# Altium footprint library ZYF_IC.PcbLib: 42 footprints (part 2 of 3)
Each footprint in its own frame and in the unit in brackets; x right, y up, seen from the top. Pads: shape width x height; smd on the part's side, far side on the other; paste and mask are expansions set on the pad; w line width, h text height; cw(c..) or ccw(c..) is an arc to the next point about the centre after c.
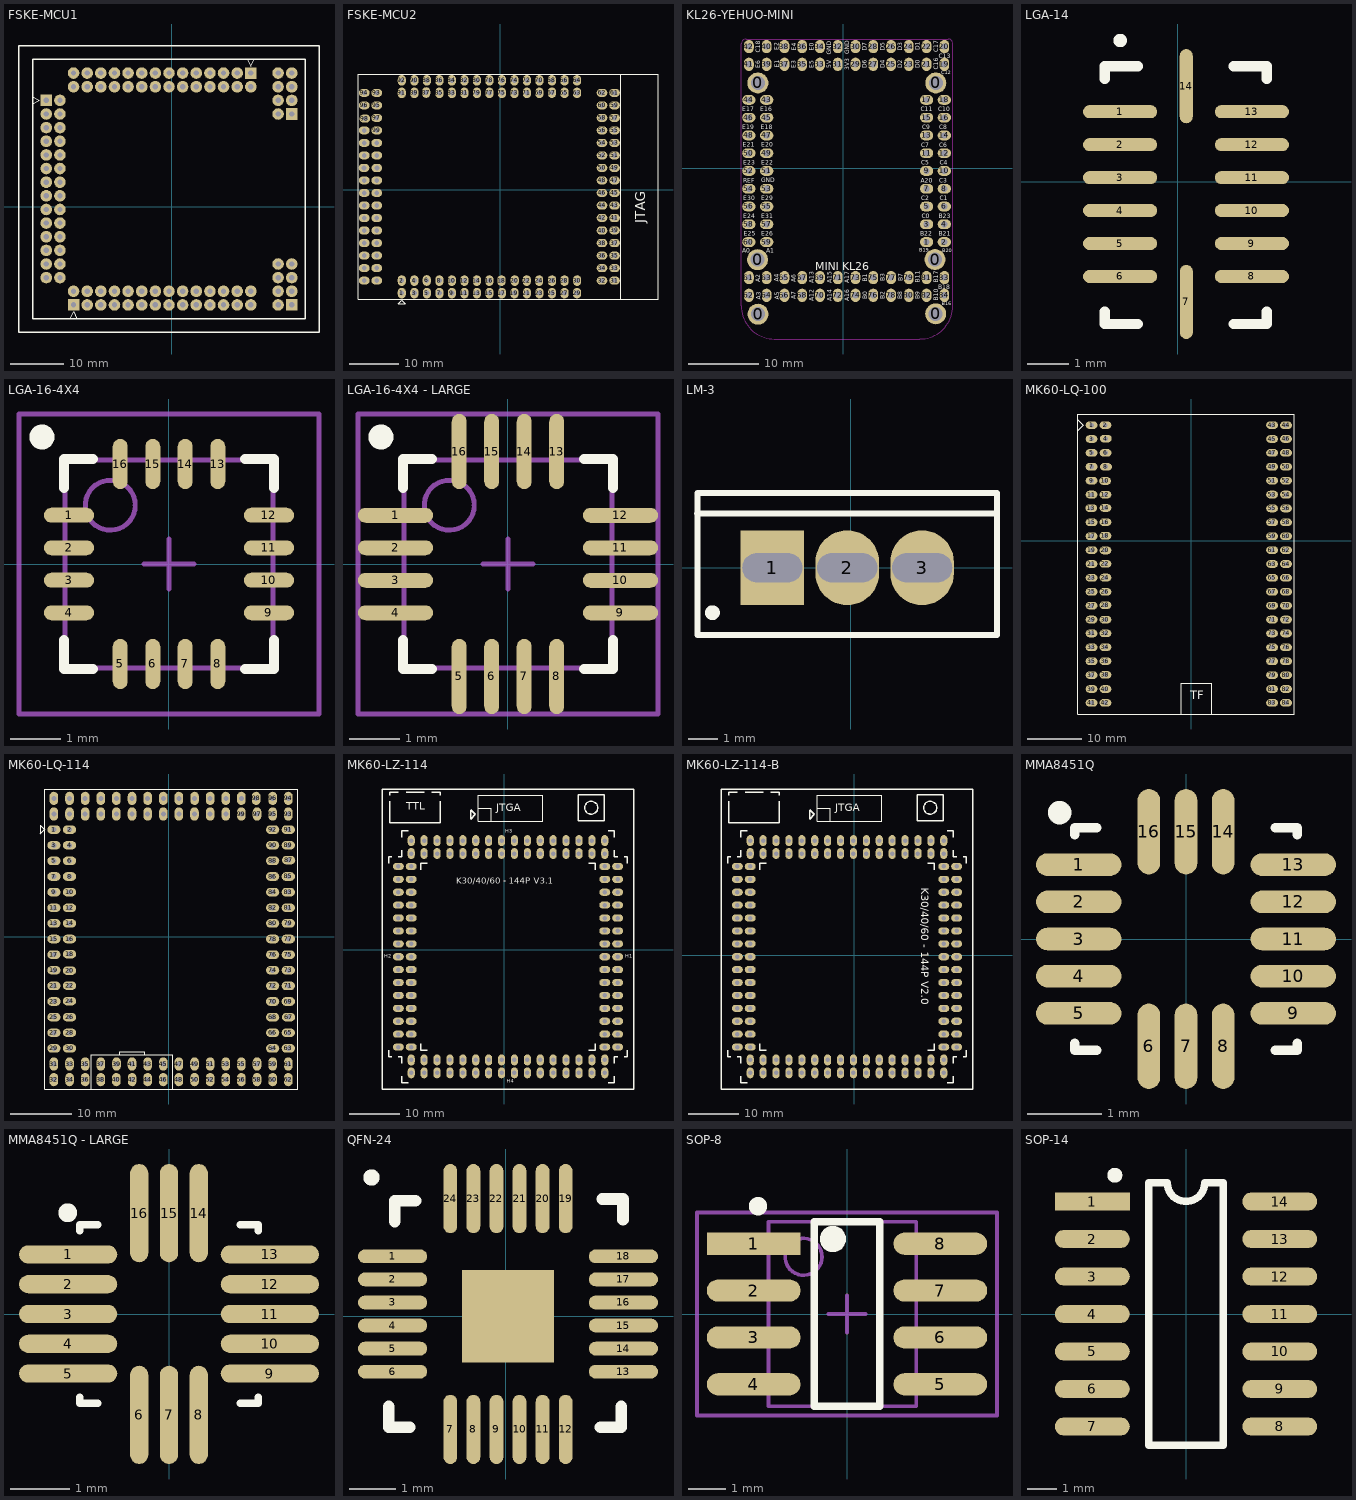
[diagram p1: the footprints below, top view; thin cyan lines are the x and y axes]

## FSKE-MCU1 [mil]
pads (100):
  rect 85x85 hole 39 paste+0: 101(-720,-720) 201(-920,780) 301(580,980) 401(880,-720) 501(880,680)
  round 85 hole 39 paste+0: 102(-720,-620) 103(-620,-720) 104(-620,-620) 105(-520,-720) 106(-520,-620) 107(-420,-720) 108(-420,-620) 109(-320,-720) 110(-320,-620) 111(-220,-720) 112(-220,-620) 113(-120,-720) 114(-120,-620) 115(-20,-720) 116(-20,-620) 117(80,-720) 118(80,-620) 119(180,-720) 120(180,-620) 121(280,-720) 122(280,-620) 123(380,-720) 124(380,-620) 125(480,-720) 126(480,-620) 127(580,-720) 128(580,-620) 202(-820,780) 203(-920,680) 204(-820,680) 205(-920,580) 206(-820,580) 207(-920,480) 208(-820,480) 209(-920,380) 210(-820,380) 211(-920,280) 212(-820,280) 213(-920,180) 214(-820,180) 215(-920,80) 216(-820,80) 217(-920,-20) 218(-820,-20) 219(-920,-120) 220(-820,-120) 221(-920,-220) 222(-820,-220) 223(-920,-320) 224(-820,-320) 225(-920,-420) 226(-820,-420) 227(-920,-520) 228(-820,-520) 302(580,880) 303(480,980) 304(480,880) 305(380,980) 306(380,880) 307(280,980) 308(280,880) 309(180,980) 310(180,880) 311(80,980) 312(80,880) 313(-20,980) 314(-20,880) 315(-120,980) 316(-120,880) 317(-220,980) 318(-220,880) 319(-320,980) 320(-320,880) 321(-420,980) 322(-420,880) 323(-520,980) 324(-520,880) 325(-620,980) 326(-620,880) 327(-720,980) 328(-720,880) 402(780,-720) 403(880,-620) 404(780,-620) 405(880,-520) 406(780,-520) 407(880,-420) 408(780,-420) 502(780,680) 503(880,780) 504(780,780) 505(880,880) 506(780,880) 507(880,980) 508(780,980)
Top Overlay:
  lines w8: -1020,755 -970,780 -1020,805 ; -745,-820 -720,-770 -695,-820 ; 555,1080 580,1030 605,1080
  lines w10: -1120,-920 1080,-920 1080,1180 -1120,1180 -1120,1140 -1120,-920 ; -1020,-820 980,-820 980,1080 -1020,1080 -1020,-820

## FSKE-MCU2 [mil]
pads (124):
  oval 65x85 hole 39: 1(-785,-825) 2(-785,-725) 3(-685,-825) 4(-685,-725) 5(-585,-825) 6(-585.39,-724.21) 7(-485,-825) 8(-485,-725) 9(-385,-825) 10(-385,-725) 11(-285,-825) 12(-284.21,-725) 13(-185,-825) 14(-185,-725) 15(-85,-825) 16(-85,-725) 17(15,-825) 18(11.85,-725) 19(115,-825) 20(117.36,-725) 21(215,-825) 22(213.82,-725) 23(315,-825) 24(312.64,-725) 25(415,-825) 26(415.39,-725) 27(515,-825) 28(515,-725) 29(615,-825) 30(615.39,-725) 63(615,775) 64(615,875) 65(515,775) 66(515,875) 67(415,776.97) 68(415,875) 69(315,775) 70(315,875) 71(215,775) 72(215,875) 73(115,775) 74(115,875) 75(15,775) 76(15,875) 77(-85,775) 78(-85,875) 79(-185,775) 80(-185,875) 81(-285,775) 82(-285,875) 83(-385,775) 84(-385,875) 85(-485,775) 86(-485,875) 87(-590.12,777.36) 88(-585,875) 89(-685,775) 90(-685,875) 91(-785,775) 92(-785,875)
  oval 85x65 hole 39: 31(915,-725) 32(815,-725) 33(915,-625) 34(815,-625) 35(915,-525) 36(815,-525) 37(915,-425) 38(815,-425) 39(915,-324.21) 40(815,-325) 41(915,-225) 42(815,-224.61) 43(915,-125) 44(815,-125) 45(915,-25) 46(815,-25) 47(915,75) 48(815,75) 49(915,175) 50(815,175) 51(915,275) 52(815,275) 53(915,375) 54(815,375) 55(915,475) 56(815,475) 57(915,575) 58(815,575) 59(915,675) 60(815,675) 61(915,775) 62(815,775) 93(-985,775) 94(-1085,775) 95(-985,675) 96(-1085,675) 97(-985,575) 98(-1079.88,569.09) 99(-985,475) 100(-1085,475) 101(-985,375) 102(-1085,375) 103(-985,275) 104(-1085,275) 105(-983.82,174.61) 106(-1086.97,175.39) 107(-985,75) 108(-1085,75) 109(-985,-25) 110(-1085,-25) 111(-985,-125) 112(-1085,-125) 113(-985,-225) 114(-1085,-225) 115(-985,-325) 116(-1085,-325) 117(-985,-425) 118(-1085,-425) 119(-985,-525) 120(-1085,-525) 121(-985,-625) 122(-1085,-625) 123(-985,-725) 124(-1085,-725)
Top Overlay:
  lines w7.87: -786.18,-884.06 -759.02,-911.61 -813.35,-911.61 -785.79,-884.06 ; 965,-875 965,925 ; -1135,-875 -1135,925 1262.24,925 1262.24,-875 -1135,-875
  text "JTAG" at 1160.67,-265.94 h78.74

## KL26-YEHUO-MINI [mil]
pads (90):
  round 118.11 hole 78.74: 0(-483.02,-513.45) 0(-481.61,481.31) 0(-480.66,-820.15) 0(515.52,-512.54) 0(519.34,-817.99) 0(519.77,481.2)
  oval 75x55 hole 35: 1(468,-414) 2(568,-414) 3(468,-314) 4(568,-314) 5(468,-214) 6(568,-214) 7(468,-114) 8(568,-114) 9(468,-14) 10(568,-14) 11(468,86) 12(568,86) 13(468,186) 14(568,186) 15(468,286) 16(568,286) 17(468,386) 18(568,386) 43(-432,386) 44(-532,386) 45(-432,286) 46(-532,286) 47(-432,186) 48(-532,186) 49(-432,86) 50(-532,86) 51(-432,-14) 52(-532,-14) 53(-432,-114) 54(-532,-114) 55(-432,-214) 56(-532,-214) 57(-432,-314) 58(-532,-314) 59(-432,-414) 60(-532,-414)
  oval 55x75 hole 35: 19(568,586) 20(568,686) 21(468,586) 22(468,686) 23(368,586) 24(368,686) 25(268,586) 26(268,686) 27(168,586) 28(168,686) 29(68,586) 30(68,686) 31(-32,586) 32(-32,686) 33(-132,586) 34(-132,686) 35(-232,586) 36(-232,686) 37(-332,586) 38(-332,686) 39(-432,586) 40(-432,686) 41(-532,586) 42(-532,686) 61(-532,-614) 62(-532,-714) 63(-432,-614) 64(-432,-714) 65(-332,-614) 66(-332,-714) 67(-232,-614) 68(-232,-714) 69(-132,-614) 70(-132,-714) 71(-32,-614) 72(-32,-714) 73(68,-614) 74(68,-714) 75(168,-614) 76(168,-714) 77(268,-614) 78(268,-714) 79(368,-614) 80(368,-714) 81(468,-614) 82(468,-714) 83(568,-614) 84(568,-714)
Top Overlay:
  text "B22" at 433.03,-380.01 h25
  text "B21" at 536.81,-379.11 h25
  text "B23" at 535.43,-280.25 h25
  text "C0" at 440.35,-278.91 h25
  text "C2" at 438.62,-178.24 h25
  text "C1" at 542.83,-179.18 h25
  text "C3" at 539.17,-79.62 h25
  text "A20" at 434.09,-80.76 h25
  text "C5" at 437.59,19.83 h25
  text "C4" at 542.2,19.83 h25
  text "C6" at 538.81,120.15 h25
  text "C7" at 437.91,120.38 h25
  text "C9" at 442.24,221.01 h25
  text "C8" at 540.51,221.49 h25
  text "C10" at 533.97,321.17 h25
  text "C11" at 434.21,320.74 h25
  text "B19" at 425.98,-468.16 h19.68
  text "B20" at 555.07,-470.33 h19.68
  text "E6" at -468.15,562.86 h25
  text "C18" at -467.09,650.82 h25
  text "E2" at -363.19,664.28 h25
  text "E1" at -362.49,566.76 h25
  text "E3" at -268.15,562.86 h25
  text "E4" at -265.83,663.02 h25
  text "E0" at -168.15,662.86 h25
  text "E5" at -168.15,562.86 h25
  text "GND" at -67.72,641.01 h25
  text "5V" at -67.8,563.26 h25
  text "3V3" at 33.46,554.08 h25
  text "GND" at 31.96,641.76 h25
  text "D7" at 131.85,662.86 h25
  text "D6" at 131.85,562.86 h25
  text "D5" at 231.85,662.86 h25
  text "D4" at 231.85,562.86 h25
  text "D3" at 331.85,662.86 h25
  text "D2" at 331.85,562.86 h25
  text "D0" at 429.99,563.57 h25
  text "D1" at 430.03,664.36 h25
  text "C17" at 533.7,652.98 h25
  text "C16" at 532.95,554.48 h25
  text "C13" at 536.33,621.49 h25
  text "C12" at 551.88,530.66 h19.68
  text "MINI KL26" at -157.72,-572.41 h45.28
  text "E25" at -561.93,-379.7 h25
  text "E26" at -462.25,-378.59 h25
  text "E31" at -463.47,-280.64 h25
  text "E24" at -564.93,-281.55 h25
  text "E30" at -563.94,-179.38 h25
  text "E29" at -462.92,-178.95 h25
  text "GND" at -462.92,-77.85 h25
  text "REF" at -562.56,-80.52 h25
  text "E23" at -564.38,21.41 h25
  text "E22" at -462.92,21.41 h25
  text "E20" at -462.92,121.52 h25
  text "E21" at -566.62,122.86 h25
  text "E19" at -568.39,221.64 h25
  text "E18" at -465.16,221.21 h25
  text "E16" at -467.37,321.41 h25
  text "E17" at -568.39,321.41 h25
  text "A0" at -568.75,-475.09 h25
  text "A1" at -434.38,-472.92 h25
  text "A2" at -466.93,-638.95 h25
  text "A3" at -466.19,-738.2 h25
  text "A4" at -363.63,-638 h25
  text "A5" at -362.41,-738.95 h25
  text "A6" at -268.98,-639.42 h25
  text "A7" at -267.01,-737.33 h25
  text "A13" at -166.54,-647.18 h25
  text "A12" at -166.54,-748.55 h25
  text "A15" at -66.54,-647.18 h25
  text "A14" at -66.54,-747.18 h25
  text "A17" at 33.46,-647.18 h25
  text "A16" at 33.46,-747.18 h25
  text "B1" at 133.03,-636.55 h25
  text "B0" at 134.36,-734.7 h25
  text "B3" at 232.75,-635.33 h25
  text "B2" at 232.08,-736.03 h25
  text "B7" at 332.95,-635.72 h25
  text "B8" at 330.86,-734.7 h25
  text "B11" at 429.29,-643 h25
  text "B9" at 429.29,-735.21 h25
  text "B17" at 532.44,-644.14 h25
  text "B10" at 533.46,-743.67 h25
  text "B18" at 534.6,-678.95 h25
  text "B16" at 553.3,-768.87 h19.68
Bottom Solder:
  text "USB TO UART" at 452.32,-945.29 h39.37
  text "USB DEVICE" at -50.6,-943.44 h39.37
Keep-Out Layer:
  lines w3.94: -574.73,-773.38 ccw(c-388.41,-773.38) -388.41,-959.7 430.66,-959.7 ccw(c430.66,-775.36) 614.99,-775.36 614.99,704.86 ccw(c591.24,704.86) 591.24,728.61 -548.02,728.61 ccw(c-548.02,701.9) -574.73,701.9 -574.73,-773.38

## LGA-14 [mm]
pads (14):
  oval 1.8x0.318 smd: 1(-1.4,1.7) 2(-1.4,0.9) 3(-1.4,0.1) 4(-1.4,-0.7) 5(-1.4,-1.5) 6(-1.4,-2.3) 8(1.8,-2.3) 9(1.8,-1.5) 10(1.8,-0.7) 11(1.8,0.1) 12(1.8,0.9) 13(1.8,1.7)
  oval 0.318x1.8 smd: 7(0.208,-2.918) 14(0.206,2.319)
Top Overlay:
  circle w0.254: c-1.397,3.429 r0.036
  lines w0.254: -1.777,-3.154 -1.777,-3.454 -0.977,-3.454 ; -1.777,2.504 -1.777,2.804 -0.977,2.804 ; 1.358,-3.454 2.158,-3.454 2.158,-3.154 ; 1.358,2.804 2.158,2.804 2.158,2.504
3D body: height 0.98, standoff -0.45, extent -1.296,-2.802 1.704,2.198

## LGA-16-4X4 [mm] "QFN, 16-Leads, Body 4x4 mm, Pitch 0.65mm, IPC Low Density"
height 1
pads (16):
  oval 1x0.3 smd: 1(-2,0.975) 2(-2,0.325) 3(-2,-0.325) 4(-2,-0.975) 9(2,-0.975) 10(2,-0.325) 11(2,0.325) 12(2,0.975)
  oval 0.3x1 smd: 5(-0.975,-2) 6(-0.325,-2) 7(0.325,-2) 8(0.975,-2) 13(0.975,2) 14(0.325,2) 15(-0.325,2) 16(-0.975,2)
Top Overlay:
  circle w0.25: c-2.54,2.54 r0.125
  lines w0.2: -2.1,-1.525 -2.1,-2.1 -1.525,-2.1 ; -2.1,1.525 -2.1,2.1 -1.525,2.1 ; 1.525,-2.1 2.1,-2.1 2.1,-1.525 ; 1.525,2.1 2.1,2.1 2.1,1.525
Mechanical 13:
  circle w0.1: c-1.175,1.175 r0.5
  lines w0.1: -2.075,-2.075 2.075,-2.075 2.075,2.075 -2.075,2.075 -2.075,-2.075
Mechanical 15:
  lines w0.1: -0.5,0 0.5,0 ; 0,-0.5 0,0.5 ; -3,-3 3,-3 3,3 -3,3 -3,-3
3D body: height 0.98, standoff 0, extent -2.003,-1.996 1.997,2.004

## LGA-16-4X4 - LARGE [mm] "QFN, 16-Leads, Body 4x4 mm, Pitch 0.65mm, IPC Low Density"
height 1
pads (16):
  oval 1.5x0.3 smd: 1(-2.25,0.975) 2(-2.25,0.325) 3(-2.25,-0.325) 4(-2.25,-0.975) 9(2.25,-0.975) 10(2.25,-0.325) 11(2.25,0.325) 12(2.25,0.975)
  oval 0.3x1.5 smd: 5(-0.975,-2.25) 6(-0.325,-2.25) 7(0.325,-2.25) 8(0.975,-2.25) 13(0.975,2.25) 14(0.325,2.25) 15(-0.325,2.25) 16(-0.975,2.25)
Top Overlay:
  circle w0.25: c-2.54,2.54 r0.125
  lines w0.2: -2.1,-1.525 -2.1,-2.1 -1.525,-2.1 ; -2.1,1.525 -2.1,2.1 -1.525,2.1 ; 1.525,-2.1 2.1,-2.1 2.1,-1.525 ; 1.525,2.1 2.1,2.1 2.1,1.525
Mechanical 13:
  circle w0.1: c-1.175,1.175 r0.5
  lines w0.1: -2.075,-2.075 -2.075,2.075 2.075,2.075 2.075,-2.075 -2.075,-2.075
Mechanical 15:
  lines w0.1: -0.5,0 0.5,0 ; 0,-0.5 0,0.5 ; -3,-3 -3,3 3,3 3,-3 -3,-3
3D body: height 0.98, standoff 0, extent -2.003,-1.996 1.997,2.004

## LM-3 [mil]
pads (3):
  rect 85x100 hole 39 slot 80 at 0 deg: 1(-105,0)
  oval 85x100 hole 39 slot 80 at 0 deg: 2(-5,0) 3(95,0)
Top Overlay:
  circle w9.84: c-185,-60 r4.92
  lines w7.87: -205.63,72.52 195,72.52 ; -205,-90 -205,100 195,100 195,-90 -205,-90
Mechanical 15:
  lines w3.94: -24.69,10 14.69,10 ; -5,-9.69 -5,29.68
3D body: height 400, standoff -207.87, extent -204.99,-84.64 195.01,100.01

## MK60-LQ-100 [mil]
pads (84):
  oval 85x55 hole 32.28: 1(-717,832) 2(-617,832) 3(-717,732) 4(-614.24,734.76) 5(-717,632) 6(-616.21,632.39) 7(-717,532) 8(-613.06,531.21) 9(-717,432) 10(-619.36,429.64) 11(-717,332) 12(-617,331.21) 13(-718.97,234.36) 14(-617,235.54) 15(-717,132) 16(-617,133.57) 17(-717,32) 18(-617,35.15) 19(-717,-68) 20(-617,-70.36) 21(-717,-168) 22(-617,-166.82) 23(-717,-268) 24(-617,-265.64) 25(-717,-368) 26(-617,-368.39) 27(-717,-468) 28(-617,-464.46) 29(-717,-568) 30(-617,-568.39) 31(-717,-668) 32(-617,-667.61) 33(-717,-768) 34(-617,-766.82) 35(-717,-868) 36(-617,-867.61) 37(-717,-968) 38(-617,-966.43) 39(-717,-1068) 40(-617,-1068.39) 41(-717,-1168) 42(-617,-1167.61) 43(583,832) 44(683,830.43) 45(583,732) 46(683,732.39) 47(583,632) 48(683,632) 49(583,532) 50(683,532) 51(583,432) 52(683,432) 53(583,332) 54(683,332) 55(583,232) 56(683,232) 57(583,132) 58(683,132) 59(583,32) 60(683,32) 61(583,-68) 62(683,-68) 63(583,-168) 64(683,-168) 65(583,-268) 66(683,-268) 67(583,-368) 68(683,-368) 69(583,-468) 70(683,-468) 71(583,-568) 72(683,-568) 73(583,-668) 74(683,-668) 75(583,-768) 76(683,-768) 77(583,-868) 78(683,-868) 79(583,-968) 80(683,-968) 81(583,-1068) 82(683,-1068) 83(583,-1168) 84(683,-1168)
Top Overlay:
  lines w7.87: -817,792 -777,832 -817,872 ; -72,-1248 -72,-1028 148,-1028 148,-1248 ; -817,-1248 -817,912 743,912 743,-1248 -817,-1248
  text "TF" at -7,-1143 h60
3D body: height 334.65, standoff -125.98, extent 529.58,-1222.93 726.43,886.91
3D body: height 334.65, standoff -125.98, extent -765.42,-1217.93 -568.57,891.92

## MK60-LQ-114 [mil]
pads (124):
  oval 85x55 hole 32: 1(-734,687) 2(-634,687) 3(-734,587) 4(-634,587) 5(-734,487) 6(-634,487) 7(-734,387) 8(-634,387) 9(-734,287) 10(-634,287) 11(-734,187) 12(-634,186.21) 13(-734,87) 14(-634,87) 15(-734,-13) 16(-634,-13) 17(-734,-113) 18(-634,-109.85) 19(-734,-213) 20(-634,-215.36) 21(-734,-313) 22(-634,-311.82) 23(-734,-413) 24(-634,-410.64) 25(-734,-513) 26(-634,-513.39) 27(-734,-613) 28(-634,-613) 29(-734,-713) 30(-634,-713.39) 63(766,-713) 64(666,-713) 65(766,-613) 66(666,-613) 67(767.97,-513) 68(666,-513) 69(766,-413) 70(666,-413) 71(766,-313) 72(666,-313) 73(766,-213) 74(666,-213) 75(766,-113) 76(666,-113) 77(766,-13) 78(666,-13) 79(766,87) 80(666,87) 81(766,187) 82(666,187) 83(766,287) 84(666,287) 85(766,387) 86(666,387) 87(768.36,492.12) 88(666,487) 89(766,587) 90(666,587) 91(766,687) 92(666,687)
  oval 55x85 hole 32: 31(-734,-813) 32(-734,-913) 33(-634,-813) 34(-634,-913) 35(-534,-813) 36(-534,-913) 37(-434,-813) 38(-434,-913) 39(-333.21,-813) 40(-334,-913) 41(-234,-813) 42(-233.61,-913) 43(-134,-813) 44(-134,-913) 45(-34,-813) 46(-34,-913) 47(66,-813) 48(66,-913) 49(166,-813) 50(166,-913) 51(266,-813) 52(266,-913) 53(366,-813) 54(366,-913) 55(466,-813) 56(466,-913) 57(566,-813) 58(566,-913) 59(666,-813) 60(666,-913) 61(766,-813) 62(766,-913) 93(766,787) 94(766,887) 95(666,787) 96(666,887) 97(566,787) 98(560.09,887) 99(466,787) 100(466,887) 101(366,787) 102(366,887) 103(266,787) 104(266,887) 105(165.61,787) 106(166.39,887) 107(66,787) 108(66,887) 109(-34,787) 110(-34,887) 111(-134,787) 112(-134,887) 113(-234,787) 114(-234,887) 115(-334,787) 116(-334,887) 117(-434,787) 118(-434,887) 119(-534,787) 120(-534,887) 121(-634,787) 122(-634,887) 123(-734,787) 124(-734,887)
Top Overlay:
  lines w5.91: -494,-973 -494,-753 26,-753 26,-973 ; -314,-753 -314,-733 -154,-733 -154,-753
  lines w7.87: -793.06,687.79 -820.61,715.35 -820.61,661.02 -793.06,688.18 ; -794,-973 -794,947 826,947 826,-973 -794,-973
3D body: height 334.65, standoff -125.98, extent -583.84,-966.43 626,-769.57
3D body: height 334.65, standoff -125.98, extent -583.84,748.57 626,945.43
3D body: height 334.65, standoff -125.98, extent 622.58,-962.93 819.43,946.92
3D body: height 334.65, standoff -125.98, extent -777.43,-962.84 -580.57,947

## MK60-LZ-114 [mil]
pads (124):
  oval 85x55 hole 35: 101(880,-755) 102(780,-755) 103(880,-655) 104(780,-655) 105(880,-555) 106(780,-555) 107(880,-455) 108(780,-455) 109(880,-355) 110(780,-355) 111(880,-255) 112(780,-255) 113(880,-155) 114(780,-155) 115(880,-55) 116(780,-55) 117(880,45) 118(780,45) 119(880,145) 120(780,145) 121(880,245) 122(780,245) 123(880,345) 124(780,345) 125(880,445) 126(780,445) 127(880,545) 128(780,545) 129(880,645) 130(780,645) 201(-720,-755) 202(-820,-755) 203(-720,-655) 204(-820,-655) 205(-720,-555) 206(-820,-555) 207(-720,-455) 208(-820,-455) 209(-720,-355) 210(-820,-355) 211(-720,-255) 212(-820,-255) 213(-720,-155) 214(-820,-155) 215(-720,-55) 216(-820,-55) 217(-720,45) 218(-820,45) 219(-720,145) 220(-820,145) 221(-720,245) 222(-820,245) 223(-720,345) 224(-820,345) 225(-720,445) 226(-820,445) 227(-720,545) 228(-820,545) 229(-720,645) 230(-820,645)
  oval 55x85 hole 35: 301(780,845) 302(780,745) 303(680,845) 304(680,745) 305(580,845) 306(580,745) 307(480,845) 308(480,745) 309(380,845) 310(380,745) 311(280,845) 312(280,745) 313(180,845) 314(180,745) 315(80,845) 316(80,745) 317(-20,845) 318(-20,745) 319(-120,845) 320(-120,745) 321(-220,845) 322(-220,745) 323(-320,845) 324(-320,745) 325(-420,845) 326(-420,745) 327(-520,845) 328(-520,745) 329(-620,845) 330(-620,745) 331(-720,845) 332(-720,745) 401(780,-855) 402(780,-955) 403(680,-855) 404(680,-955) 405(580,-855) 406(580,-955) 407(480,-855) 408(480,-955) 409(380,-855) 410(380,-955) 411(280,-855) 412(280,-955) 413(180,-855) 414(180,-955) 415(80,-855) 416(80,-955) 417(-20,-855) 418(-20,-955) 419(-120,-855) 420(-120,-955) 421(-220,-855) 422(-220,-955) 423(-320,-855) 424(-320,-955) 425(-420,-855) 426(-420,-955) 427(-520,-855) 428(-520,-955) 429(-620,-855) 430(-620,-955) 431(-720,-855) 432(-720,-955)
Top Overlay:
  circle w10: c675,1100 r50
  lines w7.87: -200,1095 -100,1095 -100,995 ; -200,995 -200,1195 300,1195 300,995 -200,995
  lines w10: -895,-780 -895,-830 -870,-830 ; -895,670 -895,720 -870,720 ; -886.85,1150 -886.85,982.2 -493.15,982.2 -493.15,1150 ; -886.85,1195 -886.85,1218.43 -820,1218.43 ; -820,-830 -795,-830 -795,-880 ; -820,720 -795,720 -795,770 ; -795,-980 -795,-1030 -745,-1030 ; -795,870 -795,920 -745,920 ; -760,1220 -620,1220 ; -645,-730 -645,-780 -595,-780 ; -645,620 -645,670 -595,670 ; -560,1218.43 -493.15,1218.43 -493.15,1195 ; -260,1080 -260,1010 -222.5,1047.5 -257.5,1082.5 ; 655,-780 705,-780 705,-730 ; 655,670 705,670 705,620 ; 805,-1030 855,-1030 855,-980 ; 805,920 855,920 855,870 ; 855,-880 855,-830 880,-830 ; 855,770 855,720 880,720 ; 930,-830 955,-830 955,-780 ; 930,720 955,720 955,670 ; -945,-1080 -945,-455 -945,1245 1005,1245 1005,-555 1005,-1080 -945,-1080 ; 575,1000 575,1200 775,1200 775,1000 575,1000
  text "V3.1" at 230,495 h80
  text "TTL" at -760,1065 h100
  text "H3" at 10,895 h50
  text "H2" at -930,-75 h50
  text "H4" at 20,-1045 h50
  text "H1" at 940,-75 h50
  text "JTGA" at -60,1055 h100
  text "K30/40/60 - 144P" at -370,495 h80

## MK60-LZ-114-B [mil]
pads (124):
  oval 55x85 hole 35: 1(694,-811) 2(694,-911) 3(594,-811) 4(594,-911) 5(494,-811) 6(494,-911) 7(394,-811) 8(394,-911) 9(294,-811) 10(294,-911) 11(194,-811) 12(194,-911) 13(94,-811) 14(94,-911) 15(-6,-811) 16(-6,-911) 17(-106,-811) 18(-106,-911) 19(-206,-811) 20(-206,-911) 21(-306,-811) 22(-306,-911) 23(-406,-811) 24(-406,-911) 25(-506,-811) 26(-506,-911) 27(-606,-811) 28(-606,-911) 29(-706,-811) 30(-706,-911) 31(-806,-811) 32(-806,-911) 63(-806,789) 64(-806,889) 65(-706,789) 66(-706,889) 67(-606,789) 68(-606,889) 69(-506,789) 70(-506,889) 71(-406,789) 72(-406,889) 73(-306,789) 74(-306,889) 75(-206,789) 76(-206,889) 77(-106,789) 78(-106,889) 79(-6,789) 80(-6,889) 81(94,789) 82(94,889) 83(194,789) 84(194,889) 85(294,789) 86(294,889) 87(394,789) 88(394,889) 89(494,789) 90(494,889) 91(594,789) 92(594,889) 93(694,789) 94(694,889)
  oval 85x55 hole 35: 33(-806,-711) 34(-906,-711) 35(-806,-611) 36(-906,-611) 37(-806,-511) 38(-906,-511) 39(-806,-411) 40(-906,-411) 41(-806,-311) 42(-906,-311) 43(-806,-211) 44(-906,-211) 45(-806,-111) 46(-906,-111) 47(-806,-11) 48(-906,-11) 49(-806,89) 50(-906,89) 51(-806,189) 52(-906,189) 53(-806,289) 54(-906,289) 55(-806,389) 56(-906,389) 57(-806,489) 58(-906,489) 59(-806,589) 60(-906,589) 61(-806,689) 62(-906,689) 95(694,689) 96(794,689) 97(694,589) 98(794,589) 99(694,489) 100(794,489) 101(694,389) 102(794,389) 103(694,289) 104(794,289) 105(694,189) 106(794,189) 107(694,89) 108(794,89) 109(694,-11) 110(794,-11) 111(694,-111) 112(794,-111) 113(694,-211) 114(794,-211) 115(694,-311) 116(794,-311) 117(694,-411) 118(794,-411) 119(694,-511) 120(794,-511) 121(694,-611) 122(794,-611) 123(694,-711) 124(794,-711)
Top Overlay:
  circle w10: c589,1144 r50
  lines w7.87: -286,1139 -186,1139 -186,1039 ; -286,1039 -286,1239 214,1239 214,1039 -286,1039
  lines w10: -981,-736 -981,-786 -956,-786 ; -981,714 -981,764 -956,764 ; -972.85,1194 -972.85,1026.2 -579.15,1026.2 -579.15,1194 ; -972.85,1239 -972.85,1262.43 -906,1262.43 ; -906,-786 -881,-786 -881,-836 ; -906,764 -881,764 -881,814 ; -881,-936 -881,-986 -831,-986 ; -881,914 -881,964 -831,964 ; -846,1264 -706,1264 ; -731,-686 -731,-736 -681,-736 ; -731,664 -731,714 -681,714 ; -646,1262.43 -579.15,1262.43 -579.15,1239 ; -346,1124 -346,1054 -308.5,1091.5 -343.5,1126.5 ; 569,-736 619,-736 619,-686 ; 569,714 619,714 619,664 ; 719,-986 769,-986 769,-936 ; 719,964 769,964 769,914 ; 769,-836 769,-786 794,-786 ; 769,814 769,764 794,764 ; 844,-786 869,-786 869,-736 ; 844,764 869,764 869,714 ; -1031,-1036 -1031,-411 -1031,1289 919,1289 919,-511 919,-1036 -1031,-1036 ; 489,1044 489,1244 689,1244 689,1044 489,1044
  text "JTGA" at -146,1099 h100
  text "K30/40/60 - 144P V2.0" at 499,524 h100

## MMA8451Q [mm]
pads (16):
  oval 1.15x0.305 smd paste-0.012 mask+0.051: 1(-1.444,1) 2(-1.444,0.5) 3(-1.444,0) 4(-1.444,-0.5) 5(-1.444,-1) 9(1.444,-1) 10(1.444,-0.5) 11(1.444,0) 12(1.444,0.5) 13(1.444,1)
  oval 0.305x1.15 smd paste-0.012 mask+0.051: 6(-0.5,-1.444) 7(0,-1.444) 8(0.5,-1.444) 14(0.5,1.444) 15(0,1.444) 16(-0.5,1.444)
Top Overlay:
  circle w0.254: c-1.7,1.7 r0.03
  lines w0.127: -1.5,-1.4 -1.5,-1.5 -1.2,-1.5 ; -1.5,1.4 -1.5,1.5 -1.2,1.5 ; 1.2,-1.5 1.5,-1.5 1.5,-1.4 ; 1.2,1.5 1.5,1.5 1.5,1.4
3D body: height 0.92, standoff 0, extent -1.481,-1.504 1.519,1.496

## MMA8451Q - LARGE [mm]
pads (16):
  oval 1.65x0.305 smd paste-0.012 mask+0.051: 1(-1.694,1) 2(-1.694,0.5) 3(-1.694,0) 4(-1.694,-0.5) 5(-1.694,-1) 9(1.694,-1) 10(1.694,-0.5) 11(1.694,0) 12(1.694,0.5) 13(1.694,1)
  oval 0.305x1.65 smd paste-0.012 mask+0.051: 6(-0.5,-1.694) 7(0,-1.694) 8(0.5,-1.694) 14(0.5,1.694) 15(0,1.694) 16(-0.5,1.694)
Top Overlay:
  circle w0.254: c-1.7,1.7 r0.03
  lines w0.127: -1.5,-1.4 -1.5,-1.5 -1.2,-1.5 ; -1.5,1.4 -1.5,1.5 -1.2,1.5 ; 1.2,-1.5 1.5,-1.5 1.5,-1.4 ; 1.2,1.5 1.5,1.5 1.5,1.4
3D body: height 0.92, standoff 0, extent -1.481,-1.504 1.519,1.496

## QFN-24 [mm]
pads (25):
  oval 1.5x0.3 smd: 1(-2.45,1.3) 2(-2.45,0.8) 3(-2.45,0.3) 4(-2.45,-0.2) 5(-2.45,-0.7) 6(-2.45,-1.2) 13(2.55,-1.2) 14(2.55,-0.7) 15(2.55,-0.2) 16(2.55,0.3) 17(2.55,0.8) 18(2.55,1.3)
  oval 0.3x1.5 smd: 7(-1.2,-2.45) 8(-0.7,-2.45) 9(-0.2,-2.45) 10(0.3,-2.45) 11(0.8,-2.45) 12(1.3,-2.45) 19(1.3,2.55) 20(0.8,2.55) 21(0.3,2.55) 22(-0.2,2.55) 23(-0.7,2.55) 24(-1.2,2.55)
  rect 2x2 smd: ""(0.05,0)
Top Overlay:
  circle w0.254: c-2.908,3.008 r0.05
  lines w0.254: -2.531,-1.954 -2.531,-2.404 -2.081,-2.404 ; -2.404,2.054 -2.404,2.504 -1.954,2.504 ; 2.054,-2.404 2.504,-2.404 2.504,-1.954 ; 2.09,2.54 2.54,2.54 2.54,2.09
3D body: height 0.88, standoff -0.02, extent -1.97,-1.97 2.07,2.07

## SOP-8 [mm]
pads (8):
  rect 2.54x0.6 smd: 1(-2.527,1.905)
  oval 2.54x0.6 smd: 2(-2.527,0.635) 3(-2.527,-0.635) 4(-2.527,-1.905) 5(2.527,-1.905) 6(2.527,-0.635) 7(2.527,0.635) 8(2.527,1.905)
Top Overlay:
  circle w0.356: c-0.381,2.032 r0.178
  circle w0.25: c-2.411,2.921 r0.125
  lines w0.2: -0.889,-2.5 0.889,-2.5 0.889,2.5 -0.889,2.5 -0.889,-2.5
Mechanical 13:
  circle w0.1: c-1.177,1.55 r0.5
  lines w0.1: -2.127,-2.5 1.873,-2.5 1.873,2.5 -2.127,2.5 -2.127,-2.5
Mechanical 15:
  lines w0.1: -0.5,0 0.5,0 ; 0,-0.5 0,0.5 ; -4.064,-2.75 4.064,-2.75 4.064,2.75 -4.064,2.75 -4.064,-2.75
3D body: height 1.6, standoff 0, extent -3.021,-2.51 3.021,2.51

## SOP-14 [mil]
pads (14):
  rect 100x24 smd: 1(-125,150)
  oval 100x24 smd: 2(-125,100) 3(-125,50) 4(-125,0) 5(-125,-50) 6(-125,-100) 7(-125,-150) 8(125,-150) 9(125,-100) 10(125,-50) 11(125,0) 12(125,50) 13(125,100) 14(125,150)
Top Overlay:
  circle w10: c-95,185 r5
  lines w10: -50,-175 50,-175 50,175 25,175 cw(c0,175) -25,175 -50,175 -50,-175
3D body: height 43.31, standoff 0, extent -145.98,-203.15 141.42,198.43